# Altium schematic symbol library Infineon Power MOSFET.SchLib: 1448 symbols (part 11 of 17) (continued)
## IPD400N06N G
designator Q?
N-Channel OptiMOS Power-Transistor, 60 V VDS, 27 A ID, -55 to 175 degC, PG-TO252-3-11, Reel, Green; Manufacturer: Infineon; PartNumber: IPD400N06N G; Green: TRUE; ID (max): 27 A; IDpuls (max): 108 A; Polarity: N; Ptot (max): 68 W; QG: 13 nC; RDS (on) (max): 40 mOhm; Rth: 2.2 K/W; RthJA (max): 75 K/W; VDS (max): 60 V; VGS(th) (max): 4 V; VGS(th) (min): 2 V; DatasheetVersion: Rev. 1.3; PackageVersion: Rev. 02, 03/2007; PackageReference: PG-TO252-3-11; PackageDescription: 3-Pin Plastic (Green) Transistor Single Outline Package, 6.57 x 6.1 mm Body, 2.29 mm Pitch; Supplier 1: Mouser; Supplier Part Number 1: 726-IPD400N06NG; Supplier 2: Digi-Key; Supplier Part Number 2: IPD400N06NGINTR-ND; Supplier 3: Digi-Key; Supplier Part Number 3: IPD400N06NGINCT-ND; Supplier 4: Digi-Key; Supplier Part Number 4: IPD400N06NGINDKR-ND; Packing: Reel; RthJC (max): 2.2 K/W; Mounting Technology: Surface Mount; ComponentLink1Description: Manufacturer URL; ComponentLink1URL: http://www.infineon.com/; ComponentLink2Description: Datasheet; ComponentLink2URL: http://www.infineon.com/dgdl/IPD400N06N+G+Rev1.3.pdf?folderId=db3a304313b8b5a60113cee8763b02d7&fileId=db3a30431be39b97011c31db9a4f795c; ComponentLink3Description: Package Specification; ComponentLink3URL: http://www.infineon.com/dgdl/IPD160N04L_rev1.0.pdf?folderId=db3a3043163797a6011643468e7505a4&fileId=db3a3043163797a60116436401cf05cf
footprint INF-PG-TO252-3-11_A_N (DPAK, 3-Leads, Body 6.57x6.1mm, Pitch 2.29mm, IPC Medium Density)
footprint INF-PG-TO252-3-11_A_L (DPAK, 3-Leads, Body 6.57x6.1mm, Pitch 2.29mm, IPC High Density)
footprint INF-PG-TO252-3-11_A_M (DPAK, 3-Leads, Body 6.57x6.1mm, Pitch 2.29mm, IPC Low Density)
pins: 1 GATE, 2 DRAIN, 3 SOURCE

## IPD530N15N3 G
designator Q?
N-Channel OptiMOS 3 Power-Transistor, 150 V VDS, 21 A ID, -55 to 175 degC, PG-TO252-3-11, Reel, Green; Manufacturer: Infineon; PartNumber: IPD530N15N3 G; Green: TRUE; ID (max): 21 A; IDpuls (max): 84 A; Polarity: N; Ptot (max): 68 W; QG: 8.7 nC; RDS (on) (max): 53 mOhm; Rth: 2.2 K/W; RthJA (max): 62 K/W; VDS (max): 150 V; VGS(th) (max): 4 V; VGS(th) (min): 2 V; DatasheetVersion: Rev. 2.5; PackageVersion: Rev. 02, 03/2007; PackageReference: PG-TO252-3-11; PackageDescription: 3-Pin Plastic (Green) Transistor Single Outline Package, 6.57 x 6.1 mm Body, 2.29 mm Pitch; Supplier 1: Mouser; Supplier Part Number 1: 726-IPD530N15N3G; Supplier 2: Newark; Supplier Part Number 2: 79X1437; Supplier 3: Farnell; Supplier Part Number 3: 2432730; Supplier 4: Digi-Key; Supplier Part Number 4: IPD530N15N3 GTR-ND; Supplier 5: Digi-Key; Supplier Part Number 5: IPD530N15N3 GCT-ND; Supplier 6: Digi-Key; Supplier Part Number 6: IPD530N15N3 GDKR-ND; Packing: Reel; RthJC (max): 2.2 K/W; Mounting Technology: Surface Mount; ComponentLink1Description: Manufacturer URL; ComponentLink1URL: http://www.infineon.com/; ComponentLink2Description: Datasheet; ComponentLink2URL: http://www.infineon.com/dgdl/IPD530N15N3_Rev2.5.pdf?folderId=db3a304326623792012669f6bee2224b&fileId=db3a30432662379201266a1f6dd2227c; ComponentLink3Description: Package Specification; ComponentLink3URL: http://www.infineon.com/dgdl/IPD160N04L_rev1.0.pdf?folderId=db3a3043163797a6011643468e7505a4&fileId=db3a3043163797a60116436401cf05cf
footprint INF-PG-TO252-3-11_A_N (DPAK, 3-Leads, Body 6.57x6.1mm, Pitch 2.29mm, IPC Medium Density)
footprint INF-PG-TO252-3-11_A_L (DPAK, 3-Leads, Body 6.57x6.1mm, Pitch 2.29mm, IPC High Density)
footprint INF-PG-TO252-3-11_A_M (DPAK, 3-Leads, Body 6.57x6.1mm, Pitch 2.29mm, IPC Low Density)
pins: 1 GATE, 2 DRAIN, 3 SOURCE

## IPD600N25N3 G
designator Q?
N-Channel OptiMOS 3 Power-Transistor, 250 V VDS, 25 A ID, -55 to 175 degC, PG-TO252-3-11, Reel, Green; Manufacturer: Infineon; PartNumber: IPD600N25N3 G; Green: TRUE; ID (max): 25 A; IDpuls (max): 100 A; Polarity: N; Ptot (max): 136 W; QG: 22 nC; RDS (on) (max): 60 mOhm; Rth: 1.1 K/W; RthJA (max): 75 K/W; VDS (max): 250 V; VGS(th) (max): 4 V; VGS(th) (min): 2 V; DatasheetVersion: Rev. 2.3; PackageVersion: Rev. 02, 03/2007; PackageReference: PG-TO252-3-11; PackageDescription: 3-Pin Plastic (Green) Transistor Single Outline Package, 6.57 x 6.1 mm Body, 2.29 mm Pitch; Supplier 1: Mouser; Supplier Part Number 1: 726-IPD600N25N3G; Supplier 2: Newark; Supplier Part Number 2: 47W3474; Supplier 3: Farnell; Supplier Part Number 3: 2212828; Supplier 4: Digi-Key; Supplier Part Number 4: IPD600N25N3 GTR-ND; Supplier 5: Digi-Key; Supplier Part Number 5: IPD600N25N3 GCT-ND; Supplier 6: Digi-Key; Supplier Part Number 6: IPD600N25N3 GDKR-ND; Packing: Reel; RthJC (max): 1.1 K/W; Mounting Technology: Surface Mount; ComponentLink1Description: Manufacturer URL; ComponentLink1URL: http://www.infineon.com/; ComponentLink2Description: Datasheet; ComponentLink2URL: http://www.infineon.com/dgdl/IPD600N25N3+G+Rev2.3.pdf?folderId=db3a3043163797a6011637d4bae7003b&fileId=db3a3043243b5f17012496b03c67195b; ComponentLink3Description: Package Specification; ComponentLink3URL: http://www.infineon.com/dgdl/IPD160N04L_rev1.0.pdf?folderId=db3a3043163797a6011643468e7505a4&fileId=db3a3043163797a60116436401cf05cf
footprint INF-PG-TO252-3-11_A_N (DPAK, 3-Leads, Body 6.57x6.1mm, Pitch 2.29mm, IPC Medium Density)
footprint INF-PG-TO252-3-11_A_L (DPAK, 3-Leads, Body 6.57x6.1mm, Pitch 2.29mm, IPC High Density)
footprint INF-PG-TO252-3-11_A_M (DPAK, 3-Leads, Body 6.57x6.1mm, Pitch 2.29mm, IPC Low Density)
pins: 1 GATE, 2 DRAIN, 3 SOURCE

## IPD640N06L G
designator Q?
N-Channel OptiMOS Power-Transistor, 60 V VDS, 18 A ID, -55 to 175 degC, PG-TO252-3-11, Reel, Green; Manufacturer: Infineon; PartNumber: IPD640N06L G; Green: TRUE; ID (max): 18 A; IDpuls (max): 72 A; Polarity: N; Ptot (max): 47 W; QG: 10 nC; RDS (on) (max): 64 mOhm; RDS (on) (max) (@4.5V): 85 mOhm; Rth: 3.2 K/W; RthJA (max): 75 K/W; VDS (max): 60 V; VGS(th) (max): 2 V; VGS(th) (min): 1.2 V; DatasheetVersion: Rev. 1.4; PackageVersion: Rev. 02, 03/2007; PackageReference: PG-TO252-3-11; PackageDescription: 3-Pin Plastic (Green) Transistor Single Outline Package, 6.57 x 6.1 mm Body, 2.29 mm Pitch; Supplier 1: Mouser; Supplier Part Number 1: 726-IPD640N06LG; Supplier 2: Newark; Supplier Part Number 2: 47W3475; Supplier 3: Farnell; Supplier Part Number 3: 2212871; Supplier 4: Digi-Key; Supplier Part Number 4: IPD640N06LGINTR-ND; Supplier 5: Digi-Key; Supplier Part Number 5: IPD640N06LGINCT-ND; Supplier 6: Digi-Key; Supplier Part Number 6: IPD640N06LGINDKR-ND; Packing: Reel; RthJC (max): 3.2 K/W; Mounting Technology: Surface Mount; ComponentLink1Description: Manufacturer URL; ComponentLink1URL: http://www.infineon.com/; ComponentLink2Description: Datasheet; ComponentLink2URL: http://www.infineon.com/dgdl/IPD640N06L%2BG%2BRev1.4.pdf?folderId=db3a30431ddc9372011ebafa04517f8b&fileId=db3a30431f848401011fcafb4ac00440; ComponentLink3Description: Package Specification; ComponentLink3URL: http://www.infineon.com/dgdl/IPD160N04L_rev1.0.pdf?folderId=db3a3043163797a6011643468e7505a4&fileId=db3a3043163797a60116436401cf05cf
footprint INF-PG-TO252-3-11_A_N (DPAK, 3-Leads, Body 6.57x6.1mm, Pitch 2.29mm, IPC Medium Density)
footprint INF-PG-TO252-3-11_A_L (DPAK, 3-Leads, Body 6.57x6.1mm, Pitch 2.29mm, IPC High Density)
footprint INF-PG-TO252-3-11_A_M (DPAK, 3-Leads, Body 6.57x6.1mm, Pitch 2.29mm, IPC Low Density)
pins: 1 GATE, 2 DRAIN, 3 SOURCE

## IPD800N06N G
designator Q?
N-Channel OptiMOS Power-Transistor, 60 V VDS, 16 A ID, -55 to 175 degC, PG-TO252-3-11, Reel, Green; Manufacturer: Infineon; PartNumber: IPD800N06N G; Green: TRUE; ID (max): 16 A; IDpuls (max): 64 A; Polarity: N; Ptot (max): 47 W; QG: 7 nC; RDS (on) (max): 80 mOhm; Rth: 3.2 K/W; RthJA (max): 75 K/W; VDS (max): 60 V; VGS(th) (max): 4 V; VGS(th) (min): 2.1 V; DatasheetVersion: Rev. 1.3; PackageVersion: Rev. 02, 03/2007; PackageReference: PG-TO252-3-11; PackageDescription: 3-Pin Plastic (Green) Transistor Single Outline Package, 6.57 x 6.1 mm Body, 2.29 mm Pitch; Supplier 1: Digi-Key; Supplier Part Number 1: IPD800N06NGINTR-ND; Supplier 2: Digi-Key; Supplier Part Number 2: IPD800N06NGINCT-ND; Supplier 3: Digi-Key; Supplier Part Number 3: IPD800N06NGINDKR-ND; Packing: Reel; RthJC (max): 3.2 K/W; Mounting Technology: Surface Mount; ComponentLink1Description: Manufacturer URL; ComponentLink1URL: http://www.infineon.com/; ComponentLink2Description: Datasheet; ComponentLink2URL: http://www.infineon.com/dgdl/IPD800N06N%2BG%2BRev1.3.pdf?folderId=db3a30431ddc9372011ebafa04517f8b&fileId=db3a30431f848401011fcaff7887044f; ComponentLink3Description: Package Specification; ComponentLink3URL: http://www.infineon.com/dgdl/IPD160N04L_rev1.0.pdf?folderId=db3a3043163797a6011643468e7505a4&fileId=db3a3043163797a60116436401cf05cf
footprint INF-PG-TO252-3-11_A_N (DPAK, 3-Leads, Body 6.57x6.1mm, Pitch 2.29mm, IPC Medium Density)
footprint INF-PG-TO252-3-11_A_L (DPAK, 3-Leads, Body 6.57x6.1mm, Pitch 2.29mm, IPC High Density)
footprint INF-PG-TO252-3-11_A_M (DPAK, 3-Leads, Body 6.57x6.1mm, Pitch 2.29mm, IPC Low Density)
pins: 1 GATE, 2 DRAIN, 3 SOURCE

## IPG16N10S4-61
designator Q?
OptiMOS-T2 Power-Transistor, 100 V VDS, 16 A ID, PG-TDSON-8-4, Reel, Green; Manufacturer: Infineon; PartNumber: IPG16N10S4-61; Green: TRUE; ID (max): 16 A; IDpuls (max): 64 A; Ptot (max): 29 W; QG: 5.4 nC; RDS (on) (max) (@10V): 61 mOhm; RthJC (max): 5.2 K/W; VDS (max): 100 V; VGS(th) (max): 3.5 V; VGS(th) (min): 2 V; DatasheetVersion: Rev. 1.0; PackageVersion: V03; PackageReference: PG-TDSON-8-4; PackageDescription: 8-Pin Plastic (Green) Thin Dual Small Outline Non Leaded Package, 5.15 x 5.9 mm Body, 1.27 mm Pitch; Halogen-free: TRUE; Packing: Reel; Technology: OptiMOS-T2; Mounting Technology: Surface Mount; ComponentLink1Description: Manufacturer URL; ComponentLink1URL: http://www.infineon.com/; ComponentLink2Description: Datasheet; ComponentLink2URL: http://www.infineon.com/dgdl/IPG16N10S4-61_DS_1_0.pdf?folderId=db3a3043156fd5730115c7d50620107c&fileId=db3a3043372d5cc8013750d9e3eb0604&location=en.Products.Automotive_ICs.Automotive_MOSFETs.Dual__N-Channel_100V_MOSFETs.DATASHEET.IPG16N10S4-61_DS_1_0.pdf; ComponentLink3Description: Package Specification; ComponentLink3URL: http://www.infineon.com/cms/packages/SMD_-_Surface_Mounted_Devices/P-PG-TDSON/P-PG-TDSON-08-04.html?__locale=en
footprint INF-PG-TDSON-8-4_V (SON, 8-Leads, Body 5.9x5.15mm, Pitch 1.27mm)
part A pins: 1 SOURCE, 2 GATE, 7 DRAIN, 8 DRAIN
part B pins: 3 SOURCE, 4 GATE, 5 DRAIN, 6 DRAIN
part A text: 7, 8
part B text: 5, 6

## IPG20N04S4-08
designator Q?
OptiMOS-T2 Power-Transistor, 40 V VDS, 20 A ID, PG-TDSON-8-4, Reel, Green; Manufacturer: Infineon; PartNumber: IPG20N04S4-08; Green: TRUE; ID (max): 20 A; IDpuls (max): 80 A; Ptot (max): 65 W; QG: 28 nC; RDS (on) (max) (@10V): 7.6 mOhm; RthJC (max): 2.3 K/W; VDS (max): 40 V; VGS(th) (max): 4 V; VGS(th) (min): 2 V; DatasheetVersion: Rev. 1.0; PackageVersion: V03; PackageReference: PG-TDSON-8-4; PackageDescription: 8-Pin Plastic (Green) Thin Dual Small Outline Non Leaded Package, 5.15 x 5.9 mm Body, 1.27 mm Pitch; Supplier 1: Mouser; Supplier Part Number 1: 726-IPG20N04S4-08; Halogen-free: TRUE; Packing: Reel; Technology: OptiMOS-T2; Mounting Technology: Surface Mount; ComponentLink1Description: Manufacturer URL; ComponentLink1URL: http://www.infineon.com/; ComponentLink2Description: Datasheet; ComponentLink2URL: http://www.infineon.com/dgdl/IPG20N04S4-08_DS_1_0.pdf?folderId=db3a3043156fd5730115c7d50620107c&fileId=db3a30432ba3fa6f012bbf5de5da6bfb&location=en.Products.Automotive_ICs.Automotive_MOSFETs.Dual__N-Channel_40V_MOSFETs.DATASHEET.IPG20N04S4-08_DS_1_0.pdf; ComponentLink3Description: Package Specification; ComponentLink3URL: http://www.infineon.com/cms/packages/SMD_-_Surface_Mounted_Devices/P-PG-TDSON/P-PG-TDSON-08-04.html?__locale=en
footprint INF-PG-TDSON-8-4_V (SON, 8-Leads, Body 5.9x5.15mm, Pitch 1.27mm)
part A pins: 1 SOURCE, 2 GATE, 7 DRAIN, 8 DRAIN
part B pins: 3 SOURCE, 4 GATE, 5 DRAIN, 6 DRAIN
part A text: 7, 8
part B text: 5, 6

## IPG20N04S4-08A
designator Q?
OptiMOS-T2 Power-Transistor, 40 V VDS, 20 A ID, PG-TDSON-8-10, Reel, Green; Manufacturer: Infineon; PartNumber: IPG20N04S4-08A; Green: TRUE; ID (max): 20 A; IDpuls (max): 80 A; Ptot (max): 65 W; QG: 28 nC; RDS (on) (max) (@10V): 7.6 mOhm; RthJC (max): 2.3 K/W; VDS (max): 40 V; VGS(th) (max): 4 V; VGS(th) (min): 2 V; DatasheetVersion: Rev. 1.0; PackageVersion: V03; PackageReference: PG-TDSON-8-10; PackageDescription: 8-Pin Plastic (Green) Thin Dual Small Outline Non Leaded Package, 5.15 x 5.9 mm Body, 1.27 mm Pitch; Halogen-free: TRUE; Packing: Reel; Technology: OptiMOS-T2; Mounting Technology: Surface Mount; ComponentLink1Description: Manufacturer URL; ComponentLink1URL: http://www.infineon.com/; ComponentLink2Description: Datasheet; ComponentLink2URL: http://www.infineon.com/dgdl/IPG20N04S4-08A_DS_1_0.pdf?folderId=db3a3043156fd5730115c7d50620107c&fileId=db3a30433d346a2d013d4547b3355142&location=en.Products.Automotive_ICs.Automotive_MOSFETs.Dual__N-Channel_40V_MOSFETs.DATASHEET.IPG20N04S4-08A_DS_1_0.pdf; ComponentLink3Description: Package Specification; ComponentLink3URL: http://www.infineon.com/cms/packages/SMD_-_Surface_Mounted_Devices/P-PG-TDSON/P-PG-TDSON-08-10.html?__locale=en
footprint INF-PG-TDSON-8-10_V (SON, 8-Leads, Body 5.9x5.15mm, Pitch 1.27mm)
part A pins: 1 SOURCE, 2 GATE, 7 DRAIN, 8 DRAIN
part B pins: 3 SOURCE, 4 GATE, 5 DRAIN, 6 DRAIN
part A text: 7, 8
part B text: 5, 6

## IPG20N04S4-09
designator Q?
OptiMOS-T2 Power-Transistor, 40 V VDS, 20 A ID, PG-TDSON-8-4, Reel, Green; Manufacturer: Infineon; PartNumber: IPG20N04S4-09; Green: TRUE; ID (max): 20 A; IDpuls (max): 80 A; Ptot (max): 54 W; QG: 21.7 nC; RDS (on) (max) (@10V): 8.6 mOhm; RthJC (max): 2.8 K/W; VDS (max): 40 V; VGS(th) (max): 4 V; VGS(th) (min): 2 V; DatasheetVersion: Rev. 1.0; PackageVersion: V03; PackageReference: PG-TDSON-8-4; PackageDescription: 8-Pin Plastic (Green) Thin Dual Small Outline Non Leaded Package, 5.15 x 5.9 mm Body, 1.27 mm Pitch; Supplier 1: Mouser; Supplier Part Number 1: 726-IPG20N04S4-09; Halogen-free: TRUE; Packing: Reel; Technology: OptiMOS-T2; Mounting Technology: Surface Mount; ComponentLink1Description: Manufacturer URL; ComponentLink1URL: http://www.infineon.com/; ComponentLink2Description: Datasheet; ComponentLink2URL: http://www.infineon.com/dgdl/IPG20N04S4-09_DS_1_0.pdf?folderId=db3a3043156fd5730115c7d50620107c&fileId=db3a30432ba3fa6f012bbf5f9f126c00&location=en.Products.Automotive_ICs.Automotive_MOSFETs.Dual__N-Channel_40V_MOSFETs.DATASHEET.IPG20N04S4-09_DS_1_0.pdf; ComponentLink3Description: Package Specification; ComponentLink3URL: http://www.infineon.com/cms/packages/SMD_-_Surface_Mounted_Devices/P-PG-TDSON/P-PG-TDSON-08-04.html?__locale=en
footprint INF-PG-TDSON-8-4_V (SON, 8-Leads, Body 5.9x5.15mm, Pitch 1.27mm)
part A pins: 1 SOURCE, 2 GATE, 7 DRAIN, 8 DRAIN
part B pins: 3 SOURCE, 4 GATE, 5 DRAIN, 6 DRAIN
part A text: 7, 8
part B text: 5, 6

## IPG20N04S4-12
designator Q?
OptiMOS-T2 Power-Transistor, 40 V VDS, 20 A ID, PG-TDSON-8-4, Reel, Green; Manufacturer: Infineon; PartNumber: IPG20N04S4-12; Green: TRUE; ID (max): 20 A; IDpuls (max): 80 A; Ptot (max): 41 W; QG: 14 nC; RDS (on) (max) (@10V): 12.2 mOhm; RthJC (max): 3.7 K/W; VDS (max): 40 V; VGS(th) (max): 4 V; VGS(th) (min): 2 V; DatasheetVersion: Rev. 1.0; PackageVersion: V03; PackageReference: PG-TDSON-8-4; PackageDescription: 8-Pin Plastic (Green) Thin Dual Small Outline Non Leaded Package, 5.15 x 5.9 mm Body, 1.27 mm Pitch; Supplier 1: Mouser; Supplier Part Number 1: 726-IPG20N04S4-12; Halogen-free: TRUE; Packing: Reel; Technology: OptiMOS-T2; Mounting Technology: Surface Mount; ComponentLink1Description: Manufacturer URL; ComponentLink1URL: http://www.infineon.com/; ComponentLink2Description: Datasheet; ComponentLink2URL: http://www.infineon.com/dgdl/IPG20N04S4-12_DS_1_0.pdf?folderId=db3a3043156fd5730115c7d50620107c&fileId=db3a30432ba3fa6f012bbf60c03c6c05&location=en.Products.Automotive_ICs.Automotive_MOSFETs.Dual__N-Channel_40V_MOSFETs.DATASHEET.IPG20N04S4-12_DS_1_0.pdf; ComponentLink3Description: Package Specification; ComponentLink3URL: http://www.infineon.com/cms/packages/SMD_-_Surface_Mounted_Devices/P-PG-TDSON/P-PG-TDSON-08-04.html?__locale=en
footprint INF-PG-TDSON-8-4_V (SON, 8-Leads, Body 5.9x5.15mm, Pitch 1.27mm)
part A pins: 1 SOURCE, 2 GATE, 7 DRAIN, 8 DRAIN
part B pins: 3 SOURCE, 4 GATE, 5 DRAIN, 6 DRAIN
part A text: 7, 8
part B text: 5, 6

## IPG20N04S4-12A
designator Q?
OptiMOS-T2 Power-Transistor, 40 V VDS, 20 A ID, PG-TDSON-8-10, Reel, Green; Manufacturer: Infineon; PartNumber: IPG20N04S4-12A; Green: TRUE; ID (max): 20 A; IDpuls (max): 80 A; Ptot (max): 41 W; QG: 14 nC; RDS (on) (max) (@10V): 12.2 mOhm; RthJC (max): 3.7 K/W; VDS (max): 40 V; VGS(th) (max): 4 V; VGS(th) (min): 2 V; DatasheetVersion: Rev. 1.0; PackageVersion: V03; PackageReference: PG-TDSON-8-10; PackageDescription: 8-Pin Plastic (Green) Thin Dual Small Outline Non Leaded Package, 5.15 x 5.9 mm Body, 1.27 mm Pitch; Halogen-free: TRUE; Packing: Reel; Technology: OptiMOS-T2; Mounting Technology: Surface Mount; ComponentLink1Description: Manufacturer URL; ComponentLink1URL: http://www.infineon.com/; ComponentLink2Description: Datasheet; ComponentLink2URL: http://www.infineon.com/dgdl/IPG20N04S4-12A_DS_1_0.pdf?folderId=db3a3043156fd5730115c7d50620107c&fileId=db3a30433d346a2d013d45445dfa5128&location=en.Products.Automotive_ICs.Automotive_MOSFETs.Dual__N-Channel_40V_MOSFETs.DATASHEET.IPG20N04S4-12A_DS_1_0.pdf; ComponentLink3Description: Package Specification; ComponentLink3URL: http://www.infineon.com/cms/packages/SMD_-_Surface_Mounted_Devices/P-PG-TDSON/P-PG-TDSON-08-10.html?__locale=en
footprint INF-PG-TDSON-8-10_V (SON, 8-Leads, Body 5.9x5.15mm, Pitch 1.27mm)
part A pins: 1 SOURCE, 2 GATE, 7 DRAIN, 8 DRAIN
part B pins: 3 SOURCE, 4 GATE, 5 DRAIN, 6 DRAIN
part A text: 7, 8
part B text: 5, 6

## IPG20N04S4L-07
designator Q?
OptiMOS-T2 Power-Transistor, 40 V VDS, 20 A ID, PG-TDSON-8-4, Reel, Green; Manufacturer: Infineon; PartNumber: IPG20N04S4L-07; Green: TRUE; ID (max): 20 A; IDpuls (max): 80 A; Ptot (max): 65 W; QG: 39 nC; RDS (on) (max) (@10V): 7.2 mOhm; RDS (on) (max) (@4.5V): 9.2 mOhm; RthJC (max): 2.3 K/W; VDS (max): 40 V; VGS(th) (max): 2.2 V; VGS(th) (min): 1.2 V; DatasheetVersion: Rev. 1.0; PackageVersion: V03; PackageReference: PG-TDSON-8-4; PackageDescription: 8-Pin Plastic (Green) Thin Dual Small Outline Non Leaded Package, 5.15 x 5.9 mm Body, 1.27 mm Pitch; Supplier 1: Mouser; Supplier Part Number 1: 726-IPG20N04S4L-07; Halogen-free: TRUE; Packing: Reel; Technology: OptiMOS-T2; Mounting Technology: Surface Mount; ComponentLink1Description: Manufacturer URL; ComponentLink1URL: http://www.infineon.com/; ComponentLink2Description: Datasheet; ComponentLink2URL: http://www.infineon.com/dgdl/IPG20N04S4L-07_DS_1_0.pdf?folderId=db3a3043156fd5730115c7d50620107c&fileId=db3a30432ba3fa6f012bbf622fcf6c0a&location=en.Products.Automotive_ICs.Automotive_MOSFETs.Dual__N-Channel_40V_MOSFETs.DATASHEET.IPG20N04S4L-07_DS_1_0.pdf; ComponentLink3Description: Package Specification; ComponentLink3URL: http://www.infineon.com/cms/packages/SMD_-_Surface_Mounted_Devices/P-PG-TDSON/P-PG-TDSON-08-04.html?__locale=en
footprint INF-PG-TDSON-8-4_V (SON, 8-Leads, Body 5.9x5.15mm, Pitch 1.27mm)
part A pins: 1 SOURCE, 2 GATE, 7 DRAIN, 8 DRAIN
part B pins: 3 SOURCE, 4 GATE, 5 DRAIN, 6 DRAIN
part A text: 7, 8
part B text: 5, 6

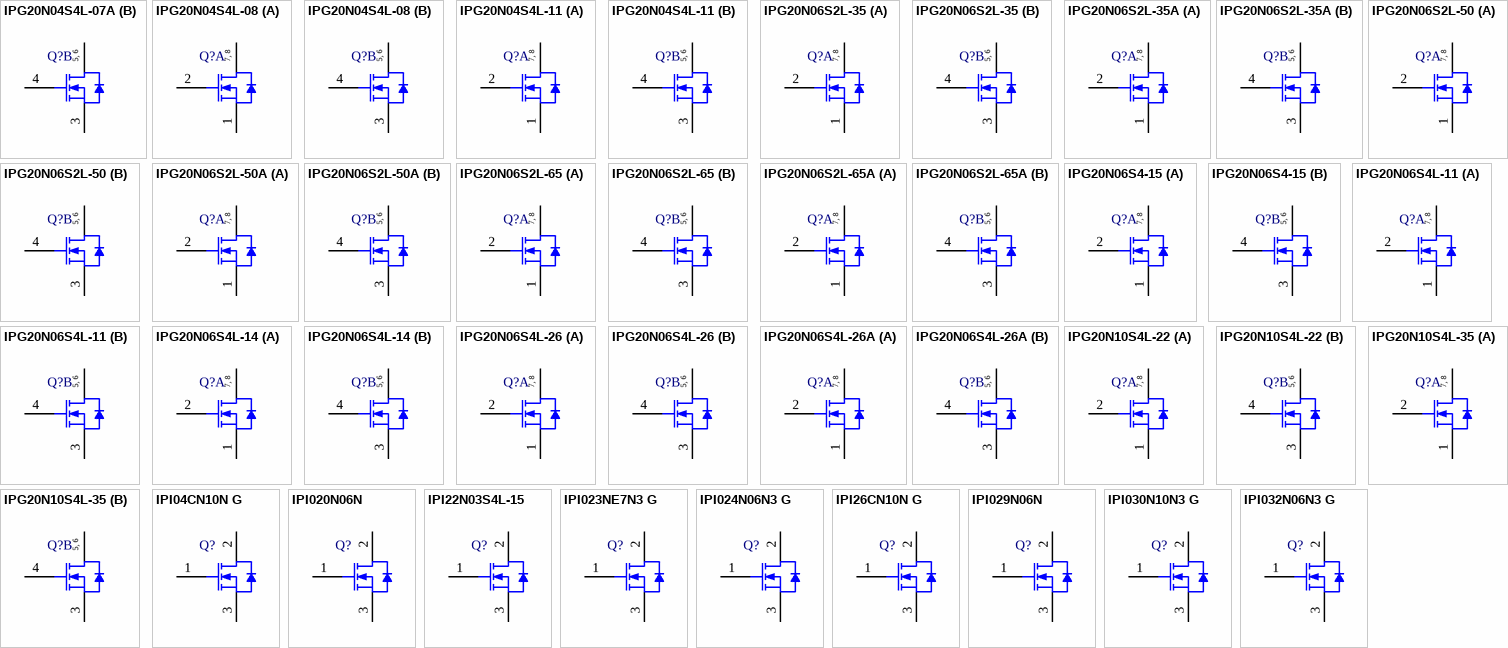
[diagram p21: symbols IPG20N04S4L-07A to IPI032N06N3 G]

## IPG20N04S4L-07A
designator Q?
OptiMOS-T2 Power-Transistor, 40 V VDS, 20 A ID, PG-TDSON-8-10, Reel, Green; Manufacturer: Infineon; PartNumber: IPG20N04S4L-07A; Green: TRUE; ID (max): 20 A; IDpuls (max): 80 A; Ptot (max): 65 W; QG: 39 nC; RDS (on) (max) (@10V): 7.2 mOhm; RDS (on) (max) (@4.5V): 9.2 mOhm; RthJC (max): 2.3 K/W; VDS (max): 40 V; VGS(th) (max): 2.2 V; VGS(th) (min): 1.2 V; DatasheetVersion: Rev. 1.0; PackageVersion: V03; PackageReference: PG-TDSON-8-10; PackageDescription: 8-Pin Plastic (Green) Thin Dual Small Outline Non Leaded Package, 5.15 x 5.9 mm Body, 1.27 mm Pitch; Supplier 1: Mouser; Supplier Part Number 1: N/A; Halogen-free: TRUE; Packing: Reel; Technology: OptiMOS-T2; Mounting Technology: Surface Mount; ComponentLink1Description: Manufacturer URL; ComponentLink1URL: http://www.infineon.com/; ComponentLink2Description: Datasheet; ComponentLink2URL: http://www.infineon.com/dgdl/IPG20N04S4L-07A_DS_1_0.pdf?folderId=db3a3043156fd5730115c7d50620107c&fileId=db3a30433d346a2d013d454a0c9d515c&location=en.Products.Automotive_ICs.Automotive_MOSFETs.Dual__N-Channel_40V_MOSFETs.DATASHEET.IPG20N04S4L-07A_DS_1_0.pdf; ComponentLink3Description: Package Specification; ComponentLink3URL: http://www.infineon.com/cms/packages/SMD_-_Surface_Mounted_Devices/P-PG-TDSON/P-PG-TDSON-08-10.html?__locale=en
footprint INF-PG-TDSON-8-10_V (SON, 8-Leads, Body 5.9x5.15mm, Pitch 1.27mm)
part A pins: 1 SOURCE, 2 GATE, 7 DRAIN, 8 DRAIN
part B pins: 3 SOURCE, 4 GATE, 5 DRAIN, 6 DRAIN
part A text: 7, 8
part B text: 5, 6

## IPG20N04S4L-08
designator Q?
OptiMOS-T2 Power-Transistor, 40 V VDS, 20 A ID, PG-TDSON-8-4, Reel, Green; Manufacturer: Infineon; PartNumber: IPG20N04S4L-08; Green: TRUE; ID (max): 20 A; IDpuls (max): 80 A; Ptot (max): 54 W; QG: 30 nC; RDS (on) (max) (@10V): 8.2 mOhm; RDS (on) (max) (@4.5V): 10.9 mOhm; RthJC (max): 2.8 K/W; VDS (max): 40 V; VGS(th) (max): 2.2 V; VGS(th) (min): 1.2 V; DatasheetVersion: Rev. 1.0; PackageVersion: V03; PackageReference: PG-TDSON-8-4; PackageDescription: 8-Pin Plastic (Green) Thin Dual Small Outline Non Leaded Package, 5.15 x 5.9 mm Body, 1.27 mm Pitch; Supplier 1: Mouser; Supplier Part Number 1: 726-IPG20N04S4L-08; Halogen-free: TRUE; Packing: Reel; Technology: OptiMOS-T2; Mounting Technology: Surface Mount; ComponentLink1Description: Manufacturer URL; ComponentLink1URL: http://www.infineon.com/; ComponentLink2Description: Datasheet; ComponentLink2URL: http://www.infineon.com/dgdl/IPG20N04S4L-08_DS_1_0.pdf?folderId=db3a3043156fd5730115c7d50620107c&fileId=db3a30432ba3fa6f012bbf634e6f6c0f&location=en.Products.Automotive_ICs.Automotive_MOSFETs.Dual__N-Channel_40V_MOSFETs.DATASHEET.IPG20N04S4L-08_DS_1_0.pdf; ComponentLink3Description: Package Specification; ComponentLink3URL: http://www.infineon.com/cms/packages/SMD_-_Surface_Mounted_Devices/P-PG-TDSON/P-PG-TDSON-08-04.html?__locale=en
footprint INF-PG-TDSON-8-4_V (SON, 8-Leads, Body 5.9x5.15mm, Pitch 1.27mm)
part A pins: 1 SOURCE, 2 GATE, 7 DRAIN, 8 DRAIN
part B pins: 3 SOURCE, 4 GATE, 5 DRAIN, 6 DRAIN
part A text: 7, 8
part B text: 5, 6

## IPG20N04S4L-11
designator Q?
OptiMOS-T2 Power-Transistor, 40 V VDS, 20 A ID, PG-TDSON-8-4, Reel, Green; Manufacturer: Infineon; PartNumber: IPG20N04S4L-11; Green: TRUE; ID (max): 20 A; IDpuls (max): 80 A; Ptot (max): 41 W; QG: 20 nC; RDS (on) (max) (@10V): 11.6 mOhm; RDS (on) (max) (@4.5V): 15.5 mOhm; RthJC (max): 3.7 K/W; VDS (max): 40 V; VGS(th) (max): 2.2 V; VGS(th) (min): 1.2 V; DatasheetVersion: Rev. 1.0; PackageVersion: V03; PackageReference: PG-TDSON-8-4; PackageDescription: 8-Pin Plastic (Green) Thin Dual Small Outline Non Leaded Package, 5.15 x 5.9 mm Body, 1.27 mm Pitch; Supplier 1: Mouser; Supplier Part Number 1: 726-IPG20N04S4L-11; Halogen-free: TRUE; Packing: Reel; Technology: OptiMOS-T2; Mounting Technology: Surface Mount; ComponentLink1Description: Manufacturer URL; ComponentLink1URL: http://www.infineon.com/; ComponentLink2Description: Datasheet; ComponentLink2URL: http://www.infineon.com/dgdl/IPG20N04S4L-11_DS_1_0.pdf?folderId=db3a3043156fd5730115c7d50620107c&fileId=db3a30432ba3fa6f012bbf644b016c14&location=en.Products.Automotive_ICs.Automotive_MOSFETs.Dual__N-Channel_40V_MOSFETs.DATASHEET.IPG20N04S4L-11_DS_1_0.pdf; ComponentLink3Description: Package Specification; ComponentLink3URL: http://www.infineon.com/cms/packages/SMD_-_Surface_Mounted_Devices/P-PG-TDSON/P-PG-TDSON-08-04.html?__locale=en
footprint INF-PG-TDSON-8-4_V (SON, 8-Leads, Body 5.9x5.15mm, Pitch 1.27mm)
part A pins: 1 SOURCE, 2 GATE, 7 DRAIN, 8 DRAIN
part B pins: 3 SOURCE, 4 GATE, 5 DRAIN, 6 DRAIN
part A text: 7, 8
part B text: 5, 6

## IPG20N06S2L-35
designator Q?
OptiMOS Power-Transistor, 55 V VDS, 20 A ID, PG-TDSON-8-4, Reel, Green; Manufacturer: Infineon; PartNumber: IPG20N06S2L-35; Green: TRUE; ID (max): 20 A; IDpuls (max): 80 A; Ptot (max): 65 W; QG: 18 nC; RDS (on) (max) (@10V): 35 mOhm; RDS (on) (max) (@4.5V): 44 mOhm; RthJC (max): 2.3 K/W; VDS (max): 55 V; VGS(th) (max): 2.2 V; VGS(th) (min): 1.2 V; DatasheetVersion: Rev. 1.0; PackageVersion: V03; PackageReference: PG-TDSON-8-4; PackageDescription: 8-Pin Plastic (Green) Thin Dual Small Outline Non Leaded Package, 5.15 x 5.9 mm Body, 1.27 mm Pitch; Supplier 1: Mouser; Supplier Part Number 1: 726-IPG20N06S2L-35; Supplier 2: Digi-Key; Supplier Part Number 2: IPG20N06S2L-35-ND; Halogen-free: TRUE; Packing: Reel; Technology: OptiMOS; Mounting Technology: Surface Mount; ComponentLink1Description: Manufacturer URL; ComponentLink1URL: http://www.infineon.com/; ComponentLink2Description: Datasheet; ComponentLink2URL: http://www.infineon.com/dgdl/IPG20N06S2L-35_DS_10.pdf?folderId=db3a304412b407950112b4322c6d574b&fileId=db3a30432313ff5e0123a3b9596f2692&location=en.Products.Automotive_ICs.Automotive_MOSFETs.Dual__N-Channel_55V_MOSFETs.DATASHEET.IPG20N06S2L-35_DS_10.pdf; ComponentLink3Description: Package Specification; ComponentLink3URL: http://www.infineon.com/cms/packages/SMD_-_Surface_Mounted_Devices/P-PG-TDSON/P-PG-TDSON-08-04.html?__locale=en
footprint INF-PG-TDSON-8-4_V (SON, 8-Leads, Body 5.9x5.15mm, Pitch 1.27mm)
part A pins: 1 SOURCE, 2 GATE, 7 DRAIN, 8 DRAIN
part B pins: 3 SOURCE, 4 GATE, 5 DRAIN, 6 DRAIN
part A text: 7, 8
part B text: 5, 6

## IPG20N06S2L-35A
designator Q?
OptiMOS Power-Transistor, 55 V VDS, 20 A ID, PG-TDSON-8-10, Reel, Green; Manufacturer: Infineon; PartNumber: IPG20N06S2L-35A; Green: TRUE; ID (max): 20 A; IDpuls (max): 80 A; Ptot (max): 65 W; QG: 18 nC; RDS (on) (max) (@10V): 35 mOhm; RDS (on) (max) (@4.5V): 44 mOhm; RthJC (max): 2.3 K/W; VDS (max): 55 V; VGS(th) (max): 2.2 V; VGS(th) (min): 1.2 V; DatasheetVersion: Rev. 1.0; PackageVersion: V03; PackageReference: PG-TDSON-8-10; PackageDescription: 8-Pin Plastic (Green) Thin Dual Small Outline Non Leaded Package, 5.15 x 5.9 mm Body, 1.27 mm Pitch; Halogen-free: TRUE; Packing: Reel; Technology: OptiMOS; Mounting Technology: Surface Mount; ComponentLink1Description: Manufacturer URL; ComponentLink1URL: http://www.infineon.com/; ComponentLink2Description: Datasheet; ComponentLink2URL: http://www.infineon.com/dgdl/IPG20N06S2L-35A_DS_10.pdf?folderId=db3a3043156fd5730115c7d50620107c&fileId=db3a30433d346a2d013d4550adaa5193&location=en.Products.Automotive_ICs.Automotive_MOSFETs.Dual__N-Channel_55V_MOSFETs.DATASHEET.IPG20N06S2L-35A_DS_10.pdf; ComponentLink3Description: Package Specification; ComponentLink3URL: http://www.infineon.com/cms/packages/SMD_-_Surface_Mounted_Devices/P-PG-TDSON/P-PG-TDSON-08-10.html?__locale=en
footprint INF-PG-TDSON-8-10_V (SON, 8-Leads, Body 5.9x5.15mm, Pitch 1.27mm)
part A pins: 1 SOURCE, 2 GATE, 7 DRAIN, 8 DRAIN
part B pins: 3 SOURCE, 4 GATE, 5 DRAIN, 6 DRAIN
part A text: 7, 8
part B text: 5, 6

## IPG20N06S2L-50
designator Q?
OptiMOS Power-Transistor, 55 V VDS, 20 A ID, PG-TDSON-8-4, Reel, Green; Manufacturer: Infineon; PartNumber: IPG20N06S2L-50; Green: TRUE; ID (max): 20 A; IDpuls (max): 80 A; Ptot (max): 51 W; QG: 12.4 nC; RDS (on) (max) (@10V): 50 mOhm; RDS (on) (max) (@4.5V): 60 mOhm; RthJC (max): 2.9 K/W; VDS (max): 55 V; VGS(th) (max): 2.2 V; VGS(th) (min): 1.2 V; DatasheetVersion: Rev. 1.0; PackageVersion: V03; PackageReference: PG-TDSON-8-4; PackageDescription: 8-Pin Plastic (Green) Thin Dual Small Outline Non Leaded Package, 5.15 x 5.9 mm Body, 1.27 mm Pitch; Supplier 1: Mouser; Supplier Part Number 1: 726-IPG20N06S2L-50; Supplier 2: Digi-Key; Supplier Part Number 2: IPG20N06S2L-50-ND; Halogen-free: TRUE; Packing: Reel; Technology: OptiMOS; Mounting Technology: Surface Mount; ComponentLink1Description: Manufacturer URL; ComponentLink1URL: http://www.infineon.com/; ComponentLink2Description: Datasheet; ComponentLink2URL: http://www.infineon.com/dgdl/IPG20N06S2L-50_DS_10.pdf?folderId=db3a304412b407950112b4322c6d574b&fileId=db3a30432313ff5e0123a3bf936226b1&location=en.Products.Automotive_ICs.Automotive_MOSFETs.Dual__N-Channel_55V_MOSFETs.DATASHEET.IPG20N06S2L-50_DS_10.pdf; ComponentLink3Description: Package Specification; ComponentLink3URL: http://www.infineon.com/cms/packages/SMD_-_Surface_Mounted_Devices/P-PG-TDSON/P-PG-TDSON-08-04.html?__locale=en
footprint INF-PG-TDSON-8-4_V (SON, 8-Leads, Body 5.9x5.15mm, Pitch 1.27mm)
part A pins: 1 SOURCE, 2 GATE, 7 DRAIN, 8 DRAIN
part B pins: 3 SOURCE, 4 GATE, 5 DRAIN, 6 DRAIN
part A text: 7, 8
part B text: 5, 6

## IPG20N06S2L-50A
designator Q?
OptiMOS Power-Transistor, 55 V VDS, 20 A ID, PG-TDSON-8-10, Reel, Green; Manufacturer: Infineon; PartNumber: IPG20N06S2L-50A; Green: TRUE; ID (max): 20 A; IDpuls (max): 80 A; Ptot (max): 51 W; QG: 12.4 nC; RDS (on) (max) (@10V): 50 mOhm; RDS (on) (max) (@4.5V): 60 mOhm; RthJC (max): 2.9 K/W; VDS (max): 55 V; VGS(th) (max): 2.2 V; VGS(th) (min): 1.2 V; DatasheetVersion: Rev. 1.0; PackageVersion: V03; PackageReference: PG-TDSON-8-10; PackageDescription: 8-Pin Plastic (Green) Thin Dual Small Outline Non Leaded Package, 5.15 x 5.9 mm Body, 1.27 mm Pitch; Supplier 1: Mouser; Supplier Part Number 1: N/A; Halogen-free: TRUE; Packing: Reel; Technology: OptiMOS; Mounting Technology: Surface Mount; ComponentLink1Description: Manufacturer URL; ComponentLink1URL: http://www.infineon.com/; ComponentLink2Description: Datasheet; ComponentLink2URL: http://www.infineon.com/dgdl/IPG20N06S2L-50A_DS_1_0.pdf?folderId=db3a3043156fd5730115c7d50620107c&fileId=db3a30433d346a2d013d4552ed7b51ae&location=en.Products.Automotive_ICs.Automotive_MOSFETs.Dual__N-Channel_55V_MOSFETs.DATASHEET.IPG20N06S2L-50A_DS_1_0.pdf; ComponentLink3Description: Package Specification; ComponentLink3URL: http://www.infineon.com/cms/packages/SMD_-_Surface_Mounted_Devices/P-PG-TDSON/P-PG-TDSON-08-10.html?__locale=en
footprint INF-PG-TDSON-8-10_V (SON, 8-Leads, Body 5.9x5.15mm, Pitch 1.27mm)
part A pins: 1 SOURCE, 2 GATE, 7 DRAIN, 8 DRAIN
part B pins: 3 SOURCE, 4 GATE, 5 DRAIN, 6 DRAIN
part A text: 7, 8
part B text: 5, 6

## IPG20N06S2L-65
designator Q?
OptiMOS Power-Transistor, 55 V VDS, 20 A ID, PG-TDSON-8-4, Reel, Green; Manufacturer: Infineon; PartNumber: IPG20N06S2L-65; Green: TRUE; ID (max): 20 A; IDpuls (max): 80 A; Ptot (max): 43 W; QG: 10 nC; RDS (on) (max) (@10V): 65 mOhm; RDS (on) (max) (@4.5V): 79 mOhm; RthJC (max): 3.5 K/W; VDS (max): 55 V; VGS(th) (max): 2.2 V; VGS(th) (min): 1.2 V; DatasheetVersion: Rev. 1.0; PackageVersion: V03; PackageReference: PG-TDSON-8-4; PackageDescription: 8-Pin Plastic (Green) Thin Dual Small Outline Non Leaded Package, 5.15 x 5.9 mm Body, 1.27 mm Pitch; Supplier 1: Mouser; Supplier Part Number 1: 726-IPG20N06S2L-65; Supplier 2: Digi-Key; Supplier Part Number 2: IPG20N06S2L-65-ND; Halogen-free: TRUE; Packing: Reel; Technology: OptiMOS; Mounting Technology: Surface Mount; ComponentLink1Description: Manufacturer URL; ComponentLink1URL: http://www.infineon.com/; ComponentLink2Description: Datasheet; ComponentLink2URL: http://www.infineon.com/dgdl/IPG20N06S2L-65_DS_10.pdf?folderId=db3a304412b407950112b4322c6d574b&fileId=db3a30432313ff5e0123a3c2672326cf&location=en.Products.Automotive_ICs.Automotive_MOSFETs.Dual__N-Channel_55V_MOSFETs.DATASHEET.IPG20N06S2L-65_DS_10.pdf; ComponentLink3Description: Package Specification; ComponentLink3URL: http://www.infineon.com/cms/packages/SMD_-_Surface_Mounted_Devices/P-PG-TDSON/P-PG-TDSON-08-04.html?__locale=en
footprint INF-PG-TDSON-8-4_V (SON, 8-Leads, Body 5.9x5.15mm, Pitch 1.27mm)
part A pins: 1 SOURCE, 2 GATE, 7 DRAIN, 8 DRAIN
part B pins: 3 SOURCE, 4 GATE, 5 DRAIN, 6 DRAIN
part A text: 7, 8
part B text: 5, 6
